# Altium footprint library ParsaLibrary.PcbLib: 526 footprints (part 27 of 33)
Each footprint in its own frame and in the unit in brackets; x right, y up, seen from the top. Pads: shape width x height; smd on the part's side, far side on the other; paste and mask are expansions set on the pad; w line width, h text height; cw(c..) or ccw(c..) is an arc to the next point about the centre after c.
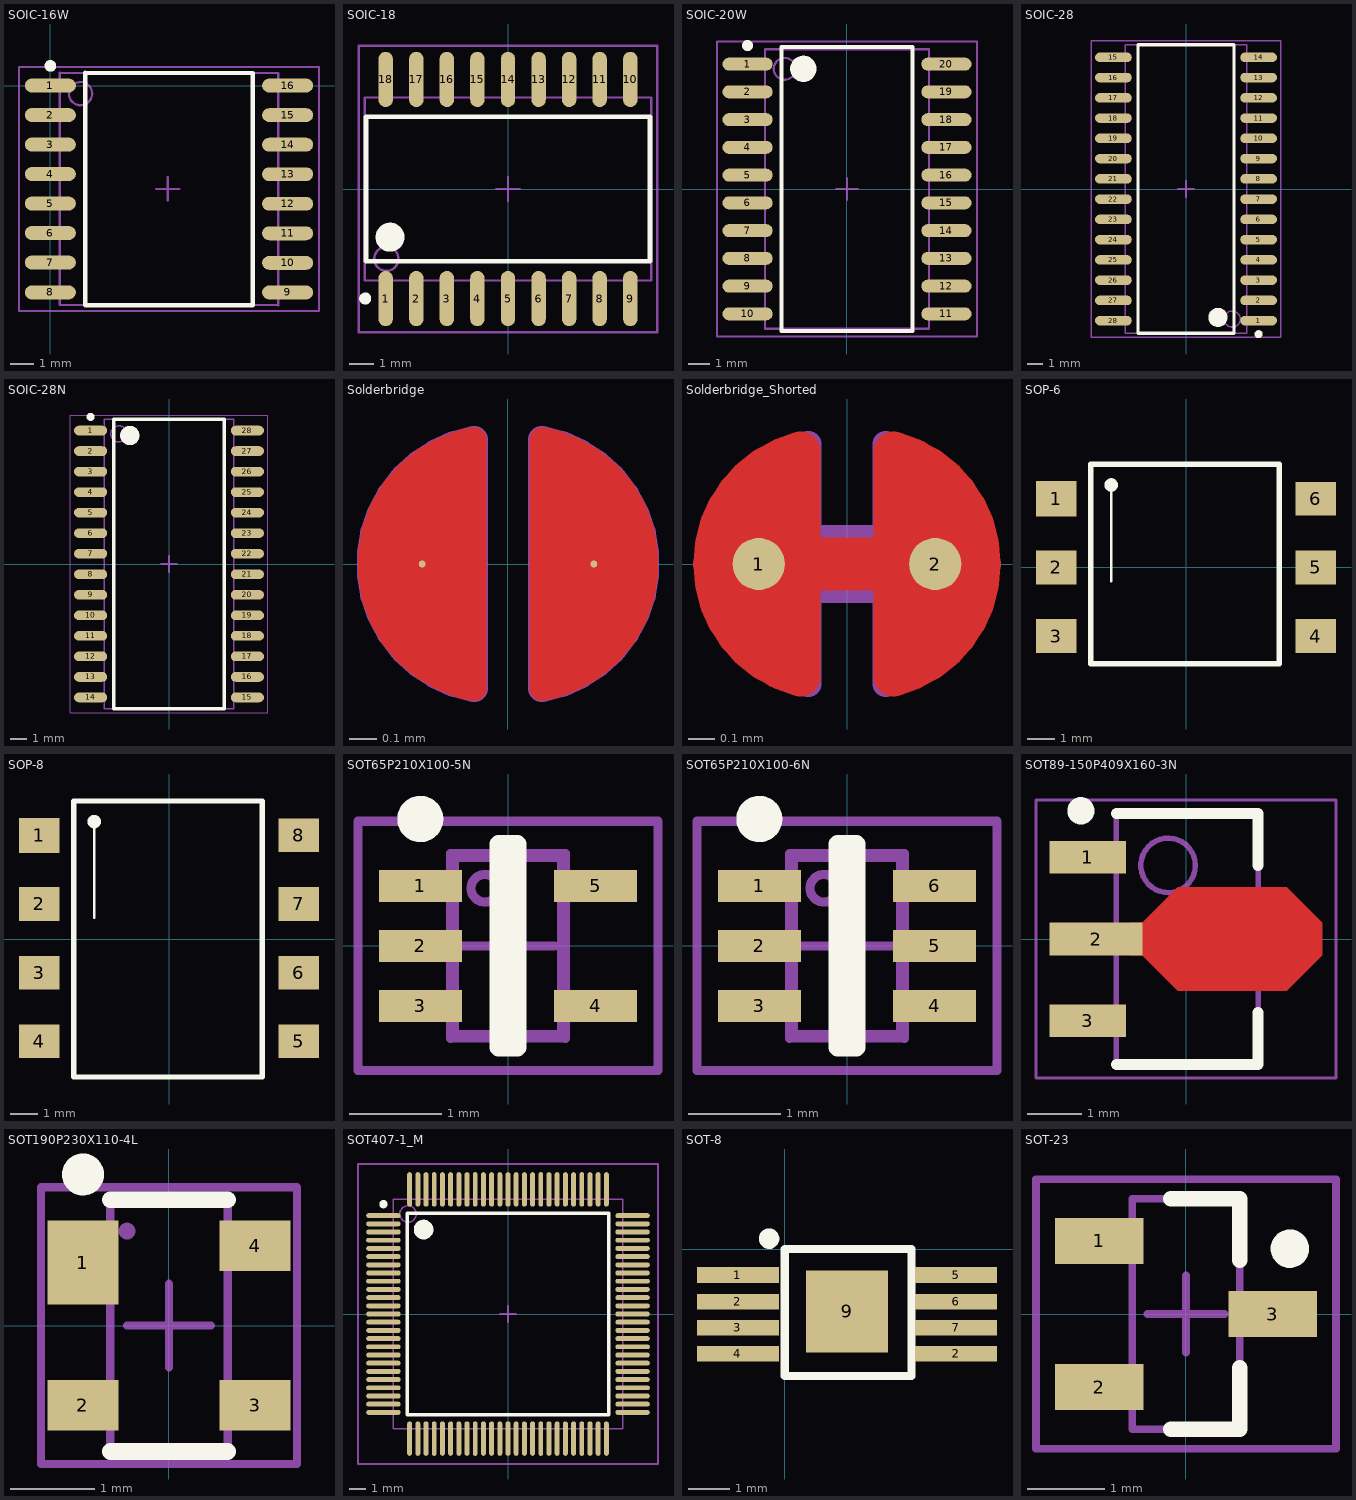
[diagram p26: the footprints below, top view; thin cyan lines are the x and y axes]

## SOIC-16W [mm]
pads (16):
  oval 2.2x0.6 smd: 1(0,0) 2(0,-1.27) 3(0,-2.54) 4(0,-3.81) 5(0,-5.08) 6(0,-6.35) 7(0,-7.62) 8(0,-8.905) 9(10.223,-8.905) 10(10.223,-7.633) 11(10.223,-6.361) 12(10.223,-5.088) 13(10.223,-3.816) 14(10.223,-2.544) 15(10.223,-1.272) 16(10.223,0)
Top Overlay:
  circle w0.25: c0,0.85 r0.125
  lines w0.2: 1.5,-9.447 8.723,-9.458 ; 1.5,-9.445 1.5,0.555 ; 1.5,0.551 8.723,0.54 8.723,-9.46
Mechanical 13:
  circle w0.1: c1.3,-0.345 r0.5
  lines w0.1: 0.4,-9.448 9.823,-9.46 9.823,0.54 0.4,0.551 ; 0.4,-9.445 0.4,0.555
Mechanical 15:
  lines w0.1: -1.35,-9.699 11.573,-9.71 11.573,0.79 ; -1.35,-9.695 -1.35,0.805 ; -1.35,0.799 11.573,0.799 ; 4.564,-4.451 5.564,-4.451 ; 5.064,-4.951 5.064,-3.951
3D body "User Library-SOIC16_Wide_JEDEC_MS-013AA.step": height 2.72, standoff 0.07, extent -0.251,-9.701 10.379,0.799

## SOIC-18 [mm]
pads (18):
  oval 0.6x2.3 smd: 1(-5.08,-4.55) 2(-3.81,-4.55) 3(-2.54,-4.55) 4(-1.27,-4.55) 5(0,-4.55) 6(1.27,-4.55) 7(2.54,-4.55) 8(3.81,-4.55) 9(5.08,-4.55) 10(5.08,4.55) 11(3.81,4.55) 12(2.54,4.55) 13(1.27,4.55) 14(0,4.55) 15(-1.27,4.55) 16(-2.54,4.55) 17(-3.81,4.55) 18(-5.08,4.55)
Top Overlay:
  circle w0.25: c-5.93,-4.55 r0.125
  circle w0.6: c-4.9,-2 r0.3
  lines w0.2: -5.9,-3 5.9,-3 5.9,3 -5.9,3 -5.9,-3
Mechanical 13:
  circle w0.1: c-5.05,-2.9 r0.5
  lines w0.1: -5.95,-3.8 5.95,-3.8 5.95,3.8 -5.95,3.8 -5.95,-3.8
Mechanical 15:
  lines w0.1: -0.5,0 0.5,0 ; 0,-0.5 0,0.5 ; -6.2,-5.95 6.2,-5.95 6.2,5.95 -6.2,5.95 -6.2,-5.95
3D body "User Library-SOIC18-300.step": height 2.65, standoff 0, extent -5.765,-5.15 5.765,5.15

## SOIC-20W [mm]
pads (20):
  oval 2.3x0.6 smd: 1(-4.55,5.715) 2(-4.55,4.445) 3(-4.55,3.175) 4(-4.55,1.905) 5(-4.55,0.635) 6(-4.55,-0.635) 7(-4.55,-1.905) 8(-4.55,-3.175) 9(-4.55,-4.445) 10(-4.55,-5.715) 11(4.55,-5.715) 12(4.55,-4.445) 13(4.55,-3.175) 14(4.55,-1.905) 15(4.55,-0.635) 16(4.55,0.635) 17(4.55,1.905) 18(4.55,3.175) 19(4.55,4.445) 20(4.55,5.715)
Top Overlay:
  circle w0.25: c-4.55,6.565 r0.125
  circle w0.6: c-2,5.5 r0.3
  lines w0.2: -3,-6.5 -3,6.5 3,6.5 3,-6.5 -3,-6.5
Mechanical 13:
  circle w0.1: c-2.85,5.5 r0.5
  lines w0.1: -3.75,-6.4 -3.75,6.4 3.75,6.4 3.75,-6.4 -3.75,-6.4
Mechanical 15:
  lines w0.1: -0.5,0 0.5,0 ; 0,-0.5 0,0.5 ; -5.95,-6.75 -5.95,6.75 5.95,6.75 5.95,-6.75 -5.95,-6.75
3D body "SO20_WIDE.step": height 1.7, standoff 0, extent -5.321,-6.223 5.321,6.223

## SOIC-28 [mm]
pads (28):
  oval 2.3x0.6 smd: 1(4.55,-8.255) 2(4.55,-6.985) 3(4.55,-5.715) 4(4.55,-4.445) 5(4.55,-3.175) 6(4.55,-1.905) 7(4.55,-0.635) 8(4.55,0.635) 9(4.55,1.905) 10(4.55,3.175) 11(4.55,4.445) 12(4.55,5.715) 13(4.55,6.985) 14(4.55,8.255) 15(-4.55,8.255) 16(-4.55,6.985) 17(-4.55,5.715) 18(-4.55,4.445) 19(-4.55,3.175) 20(-4.55,1.905) 21(-4.55,0.635) 22(-4.55,-0.635) 23(-4.55,-1.905) 24(-4.55,-3.175) 25(-4.55,-4.445) 26(-4.55,-5.715) 27(-4.55,-6.985) 28(-4.55,-8.255)
Top Overlay:
  circle w0.25: c4.55,-9.105 r0.125
  circle w0.6: c2,-8.05 r0.3
  lines w0.2: -3,-9.05 -3,9.05 3,9.05 3,-9.05 -3,-9.05
Mechanical 13:
  circle w0.1: c2.9,-8.155 r0.5
  lines w0.1: -3.8,-9.055 -3.8,9.055 3.8,9.055 3.8,-9.055 -3.8,-9.055
Mechanical 15:
  lines w0.1: -0.5,0 0.5,0 ; 0,-0.5 0,0.5 ; -5.95,-9.3 -5.95,9.3 5.95,9.3 5.95,-9.3 -5.95,-9.3
3D body "User Library-28-SOIC.step": height 2.83, standoff 0.07, extent -5.15,-9.017 5.15,8.883

## SOIC-28N [mm]
pads (28):
  oval 2.05x0.6 smd: 1(-4.85,8.255) 2(-4.85,6.985) 3(-4.85,5.715) 4(-4.85,4.445) 5(-4.85,3.175) 6(-4.85,1.905) 7(-4.85,0.635) 8(-4.85,-0.635) 9(-4.85,-1.905) 10(-4.85,-3.175) 11(-4.85,-4.445) 12(-4.85,-5.715) 13(-4.85,-6.985) 14(-4.85,-8.255) 15(4.85,-8.255) 16(4.85,-6.985) 17(4.85,-5.715) 18(4.85,-4.445) 19(4.85,-3.175) 20(4.85,-1.905) 21(4.85,-0.635) 22(4.85,0.635) 23(4.85,1.905) 24(4.85,3.175) 25(4.85,4.445) 26(4.85,5.715) 27(4.85,6.985) 28(4.85,8.255)
Top Overlay:
  circle w0.25: c-4.85,9.105 r0.125
  circle w0.6: c-2.425,7.95 r0.3
  lines w0.2: -3.425,-8.95 -3.425,8.95 3.425,8.95 3.425,-8.95 -3.425,-8.95
Mechanical 13:
  circle w0.1: c-3.1,8.05 r0.5
  lines w0.1: -4,-8.95 -4,8.95 4,8.95 4,-8.95 -4,-8.95
Mechanical 15:
  lines w0.05: -6.1,-9.2 -6.1,9.2 6.1,9.2 6.1,-9.2 -6.1,-9.2
  lines w0.1: -0.5,0 0.5,0 ; 0,-0.5 0,0.5
3D body "SOIC28 wide.stp": height 2, standoff 0, extent -5.081,-9.04 5.082,9.04

## Solderbridge [mil]
pads (2):
  round 1 smd: 1(-12.44,0) 2(12.44,0)
Top Layer:
  region: -3.14,17.94 -3.14,18.31 -3.42,18.99 -3.94,19.52 -4.63,19.8 -5,19.8 -4.99,19.8 -6.74,19.51 -10.06,18.32 -13.14,16.57 -15.86,14.32 -18.14,11.62 -19.91,8.56 -21.13,5.24 -21.75,1.76 -21.74,-1.77 -21.13,-5.25 -19.91,-8.57 -18.13,-11.62 -15.85,-14.32 -13.13,-16.58 -10.06,-18.33 -6.73,-19.51 -4.98,-19.8 -5,-19.8 -4.63,-19.8 -3.94,-19.52 -3.42,-18.99 -3.14,-18.31 -3.14,-17.94
  region: 3.14,-17.94 3.14,-18.31 3.42,-18.99 3.95,-19.52 4.63,-19.8 5,-19.8 6.74,-19.51 10.07,-18.32 13.14,-16.57 15.86,-14.32 18.14,-11.62 19.92,-8.56 21.13,-5.24 21.75,-1.76 21.75,1.77 21.13,5.25 19.91,8.57 18.14,11.62 15.85,14.32 13.13,16.58 10.06,18.33 6.73,19.51 4.99,19.8 5,19.8 4.63,19.8 3.95,19.52 3.42,18.99 3.14,18.31 3.14,17.94
Mechanical 7:
  lines w3.94: -4.86,-18.07 cw(c-1.67,0) -4.86,18.07 -4.86,-18.07 ; 4.86,-18.07 ccw(c1.67,0) 4.86,18.07 4.86,-18.07
  text ".Designator" at -49.95,15.62 h15

## Solderbridge_Shorted [mm]
pads (2):
  round 0.2 smd paste-10: 1(-0.338,0) 2(0.338,0)
Top Layer:
  region: -0.102,-0.432 -0.178,-0.505 -0.296,-0.467 -0.361,-0.424 -0.434,-0.351 -0.488,-0.292 -0.546,-0.193 -0.574,-0.099 -0.569,0.122 -0.544,0.193 -0.46,0.33 -0.376,0.411 -0.284,0.469 -0.183,0.5 -0.132,0.483 -0.102,0.43
  region: 0.102,0.432 0.178,0.505 0.296,0.467 0.361,0.424 0.434,0.351 0.488,0.292 0.546,0.193 0.574,0.099 0.569,-0.122 0.544,-0.193 0.46,-0.33 0.376,-0.411 0.284,-0.469 0.183,-0.5 0.132,-0.483 0.102,-0.43
  lines w0.152: -0.178,-0.431 cw(c-0.068,0) -0.178,0.431 ; 0.178,-0.431 ccw(c0.068,0) 0.178,0.431
  lines w0.203: -0.338,0 0.338,0
Top Solder:
  circle w0.61: c0.028,0 r0.279
  circle w0.61: c-0.028,0 r0.279
Mechanical 7:
  lines w0.1: -0.148,-0.459 cw(c-0.067,0) -0.148,0.459 -0.148,0.1 0.148,0.1 0.148,0.459 cw(c0.067,0) 0.148,-0.459 0.148,-0.1 -0.148,-0.1 -0.148,-0.459
  text ".Designator" at -0.635,0.635 h0.38

## SOP-6 [mm]
pads (6):
  rect 1.5x1.3 smd: 1(-4.8,2.54)
  rect 1.5x1.25 smd: 2(-4.8,0) 3(-4.8,-2.54) 4(4.8,-2.54) 5(4.8,0) 6(4.8,2.54)
Top Overlay:
  circle w0.25: c-2.768,3.048 r0.125
  lines w0.1: -2.768,-0.508 -2.768,3.175
  lines w0.2: -3.53,-3.56 3.455,-3.56 3.455,3.81 -3.53,3.81 -3.53,-3.56
3D body "User Library-PC817_Gullwing.STEP": height 3.85, standoff 0, extent -4.974,-3.56 5.026,1.02
3D body "User Library-PC817_Gullwing.STEP": height 3.85, standoff 0, extent -4.974,-1.02 5.026,3.56

## SOP-8 [mm]
pads (8):
  rect 1.5x1.3 smd: 1(-4.8,3.84)
  rect 1.5x1.25 smd: 2(-4.8,1.3) 3(-4.8,-1.24) 4(-4.8,-3.78) 5(4.8,-3.78) 6(4.8,-1.24) 7(4.8,1.3) 8(4.8,3.84)
Top Overlay:
  circle w0.25: c-2.768,4.348 r0.125
  lines w0.1: -2.768,0.792 -2.768,4.475
  lines w0.2: -3.53,-5.1 3.455,-5.1 3.455,5.11 -3.53,5.11 -3.53,-5.1
3D body "User Library-PC817_Gullwing.STEP": height 3.85, standoff 0, extent -4.974,-2.26 5.026,2.32
3D body "User Library-PC817_Gullwing.STEP": height 3.85, standoff 0, extent -4.974,0.28 5.026,4.86
3D body "User Library-PC817_Gullwing.STEP": height 3.85, standoff 0, extent -4.974,-4.8 5.026,-0.22

## SOT65P210X100-5N [mm]
pads (5):
  rect 0.9x0.35 smd: 1(-0.95,0.65) 2(-0.95,0) 3(-0.95,-0.65) 4(0.95,-0.65) 5(0.95,0.65)
Top Overlay:
  circle w0.25: c-0.95,1.375 r0.125
  lines w0.2: -0.1,-1.1 0.1,-1.1 0.1,1.1 -0.1,1.1 -0.1,-1.1
Mechanical 7:
  circle w0.1: c-0.25,0.625 r0.15
  lines w0.1: -1.048,-0.748 -1.048,-0.545 ; -1.048,-0.101 -1.048,0.103 ; -1.048,0.547 -1.048,0.75 ; -0.862,-0.76 -0.862,-0.532 ; -0.862,-0.113 -0.862,0.115 ; -0.862,0.534 -0.862,0.762 ; -0.624,-0.999 -0.624,-0.998 ; -0.624,-0.76 -0.624,-0.998 ; -0.624,-0.532 -0.624,-0.113 ; -0.624,0.115 -0.624,0.534 ; -0.624,0.762 -0.624,1 0.624,1 0.624,0.762 ; 0.624,-0.999 0.624,-0.998 ; 0.624,-0.76 0.624,-0.998 ; 0.624,-0.532 0.624,0.534 ; 0.862,-0.76 0.862,-0.532 ; 0.862,0.534 0.862,0.762 ; 1.048,-0.748 1.048,-0.545 ; 1.048,0.547 1.048,0.75 ; -0.624,-0.998 0.624,-0.998 ; -1.048,-0.76 -1.048,-0.532 -0.611,-0.532 -0.611,-0.76 -1.048,-0.76 ; -1.048,-0.113 -0.611,-0.113 -0.611,0.115 -1.048,0.115 -1.048,-0.113 ; -1.048,0.534 -1.048,0.762 -0.611,0.762 -0.611,0.534 -1.048,0.534 ; -0.582,-0.96 0.582,-0.96 0.582,0.961 -0.582,0.961 -0.582,-0.96 ; 0.611,-0.76 1.048,-0.76 1.048,-0.532 0.611,-0.532 0.611,-0.76 ; 0.611,0.534 1.048,0.534 1.048,0.762 0.611,0.762 0.611,0.534
  text ".Designator" at 0.4,-0.55 h0.38
Mechanical 15:
  lines w0.1: -0.5,0 0.5,0 ; 0,-0.5 0,0.5 ; -1.625,-1.35 -1.625,1.35 1.625,1.35 1.625,-1.35 -1.625,-1.35
3D body "User Library-SC70-5.STEP": height 0.97, standoff 0, extent -1.1,-1 1.1,1

## SOT65P210X100-6N [mm]
pads (6):
  rect 0.9x0.35 smd: 1(-0.95,0.65) 2(-0.95,0) 3(-0.95,-0.65) 4(0.95,-0.65) 5(0.95,0) 6(0.95,0.65)
Top Overlay:
  circle w0.25: c-0.95,1.375 r0.125
  lines w0.2: -0.1,-1.1 -0.1,1.1 0.1,1.1 0.1,-1.1 -0.1,-1.1
Mechanical 7:
  circle w0.1: c-0.25,0.625 r0.15
  lines w0.1: -1.048,-0.748 -1.048,-0.545 ; -1.048,-0.101 -1.048,0.103 ; -1.048,0.547 -1.048,0.75 ; -0.862,-0.76 -0.862,-0.532 ; -0.862,-0.113 -0.862,0.115 ; -0.862,0.534 -0.862,0.762 ; -0.624,-0.999 -0.624,-0.998 ; -0.624,-0.76 -0.624,-0.998 ; -0.624,-0.532 -0.624,-0.113 ; -0.624,0.115 -0.624,0.534 ; -0.624,0.762 -0.624,1 0.624,1 0.624,0.762 ; 0.624,-0.999 0.624,-0.998 ; 0.624,-0.76 0.624,-0.998 ; 0.624,-0.532 0.624,-0.113 ; 0.624,0.115 0.624,0.534 ; 0.862,-0.76 0.862,-0.532 ; 0.862,-0.113 0.862,0.115 ; 0.862,0.534 0.862,0.762 ; 1.048,-0.748 1.048,-0.545 ; 1.048,-0.101 1.048,0.103 ; 1.048,0.547 1.048,0.75 ; -0.624,-0.998 0.624,-0.998 ; -1.048,-0.76 -1.048,-0.532 -0.611,-0.532 -0.611,-0.76 -1.048,-0.76 ; -1.048,-0.113 -0.611,-0.113 -0.611,0.115 -1.048,0.115 -1.048,-0.113 ; -1.048,0.534 -1.048,0.762 -0.611,0.762 -0.611,0.534 -1.048,0.534 ; -0.582,-0.96 0.582,-0.96 0.582,0.961 -0.582,0.961 -0.582,-0.96 ; 0.611,-0.76 1.048,-0.76 1.048,-0.532 0.611,-0.532 0.611,-0.76 ; 0.611,-0.113 0.611,0.115 1.048,0.115 1.048,-0.113 0.611,-0.113 ; 0.611,0.534 1.048,0.534 1.048,0.762 0.611,0.762 0.611,0.534
  text ".Designator" at 0.4,-0.55 h0.38
Mechanical 15:
  lines w0.1: -0.5,0 0.5,0 ; 0,-0.5 0,0.5 ; -1.625,-1.35 1.625,-1.35 1.625,1.35 -1.625,1.35 -1.625,-1.35
3D body "SW3dPS-SC70-6.STEP": height 0.92, standoff -0.03, extent -1.05,-1 1.05,1

## SOT89-150P409X160-3N [mm]
pads (3):
  rect 1.4x0.6 smd: 1(-1.8,1.5) 3(-1.8,-1.5)
  rect 1.7x0.6 smd: 2(-1.65,0)
Top Layer:
  rectangle: -1.016,-0.3 -0.635,0.3
  region: -0.8,0.3 -0.15,0.95 1.85,0.95 2.5,0.3 2.5,-0.3 1.85,-0.95 -0.15,-0.95 -0.8,-0.3
Top Overlay:
  circle w0.25: c-1.928,2.35 r0.125
  lines w0.2: -1.278,-2.3 1.322,-2.3 1.322,-1.35 ; -1.278,2.3 1.322,2.3 1.322,1.35
Mechanical 7:
  circle w0.1: c-0.327,1.35 r0.5
  lines w0.1: -1.278,-2.3 -1.278,2.3 1.322,2.3 1.322,-2.3 -1.278,-2.3
  text ".Designator" at -0.889,-0.127 h0.38
Mechanical 15:
  lines w0.05: -2.75,-2.55 -2.75,2.55 2.75,2.55 2.75,-2.55 -2.75,-2.55
  lines w0.1: -0.478,0 0.522,0 ; 0.022,-0.5 0.022,0.5
3D body "SOT89-150P409X160-3N.step": height 1.6, standoff 0, extent -2.2,-2.297 1.93,2.297

## SOT190P230X110-4L [mm]
pads (4):
  rect 0.85x1 smd: 1(-1.025,0.75)
  rect 0.85x0.6 smd: 2(-1.025,-0.95) 3(1.025,-0.95) 4(1.025,0.95)
Top Overlay:
  circle w0.25: c-1.025,1.8 r0.125
  lines w0.2: -0.7,-1.5 0.7,-1.5 ; -0.7,1.5 0.7,1.5
Mechanical 7:
  circle w0.1: c-0.5,1.125 r0.05
  lines w0.1: -0.7,-1.5 0.7,-1.5 0.7,1.5 -0.7,1.5 -0.7,-1.5
  text ".Designator" at -0.225,1.375 h0.69
Mechanical 15:
  lines w0.1: -0.5,0 0.5,0 ; 0,-0.5 0,0.5 ; -1.525,-1.65 1.525,-1.65 1.525,1.65 -1.525,1.65 -1.525,-1.65
3D body "User Library-sot143.step": height 1, standoff 0, extent -1.21,-1.46 1.21,1.46

## SOT407-1_M [mm] "Thin QFP, 100-Leads, Body 14x14mm, Pitch 0.5mm, IPC Low Density"
height 1.6
pads (100):
  oval 2.1x0.3 smd: 1(-7.6,6) 2(-7.6,5.5) 3(-7.6,5) 4(-7.6,4.5) 5(-7.6,4) 6(-7.6,3.5) 7(-7.6,3) 8(-7.6,2.5) 9(-7.6,2) 10(-7.6,1.5) 11(-7.6,1) 12(-7.6,0.5) 13(-7.6,0) 14(-7.6,-0.5) 15(-7.6,-1) 16(-7.6,-1.5) 17(-7.6,-2) 18(-7.6,-2.5) 19(-7.6,-3) 20(-7.6,-3.5) 21(-7.6,-4) 22(-7.6,-4.5) 23(-7.6,-5) 24(-7.6,-5.5) 25(-7.6,-6) 51(7.6,-6) 52(7.6,-5.5) 53(7.6,-5) 54(7.6,-4.5) 55(7.6,-4) 56(7.6,-3.5) 57(7.6,-3) 58(7.6,-2.5) 59(7.6,-2) 60(7.6,-1.5) 61(7.6,-1) 62(7.6,-0.5) 63(7.6,0) 64(7.6,0.5) 65(7.6,1) 66(7.6,1.5) 67(7.6,2) 68(7.6,2.5) 69(7.6,3) 70(7.6,3.5) 71(7.6,4) 72(7.6,4.5) 73(7.6,5) 74(7.6,5.5) 75(7.6,6)
  oval 0.3x2.1 smd: 26(-6,-7.6) 27(-5.5,-7.6) 28(-5,-7.6) 29(-4.5,-7.6) 30(-4,-7.6) 31(-3.5,-7.6) 32(-3,-7.6) 33(-2.5,-7.6) 34(-2,-7.6) 35(-1.5,-7.6) 36(-1,-7.6) 37(-0.5,-7.6) 38(0,-7.6) 39(0.5,-7.6) 40(1,-7.6) 41(1.5,-7.6) 42(2,-7.6) 43(2.5,-7.6) 44(3,-7.6) 45(3.5,-7.6) 46(4,-7.6) 47(4.5,-7.6) 48(5,-7.6) 49(5.5,-7.6) 50(6,-7.6) 76(6,7.6) 77(5.5,7.6) 78(5,7.6) 79(4.5,7.6) 80(4,7.6) 81(3.5,7.6) 82(3,7.6) 83(2.5,7.6) 84(2,7.6) 85(1.5,7.6) 86(1,7.6) 87(0.5,7.6) 88(0,7.6) 89(-0.5,7.6) 90(-1,7.6) 91(-1.5,7.6) 92(-2,7.6) 93(-2.5,7.6) 94(-3,7.6) 95(-3.5,7.6) 96(-4,7.6) 97(-4.5,7.6) 98(-5,7.6) 99(-5.5,7.6) 100(-6,7.6)
Top Overlay:
  circle w0.6: c-5.15,5.15 r0.3
  circle w0.25: c-7.6,6.7 r0.125
  lines w0.2: -6.15,-6.15 6.15,-6.15 6.15,6.15 -6.15,6.15 -6.15,-6.15
Mechanical 13:
  circle w0.1: c-6.1,6.1 r0.5
  lines w0.1: -7,-7 7,-7 7,7 -7,7 -7,-7
Mechanical 15:
  lines w0.1: -0.5,0 0.5,0 ; 0,-0.5 0,0.5 ; -9.15,-9.15 9.15,-9.15 9.15,9.15 -9.15,9.15 -9.15,-9.15
3D body: height 1.6, standoff 0, extent -7,-7 7,7

## SOT-8 [mm]
pads (9):
  rect 2x0.38 smd: 1(-1.143,-0.635) 2(-1.143,-1.285) 2(4.191,-2.555) 3(-1.143,-1.92) 4(-1.143,-2.555) 5(4.191,-0.635) 6(4.191,-1.285) 7(4.191,-1.92)
  rect 2x2 smd: 9(1.524,-1.524)
Top Overlay:
  circle w0.25: c-0.381,0.254 r0.125
  lines w0.2: 0,-3.1 0,0 3.1,0 3.1,-3.1 0,-3.1

## SOT-23 [mm]
pads (3):
  rect 1.15x0.6 smd: 1(-1.125,0.95) 2(-1.125,-0.95) 3(1.125,0)
Top Overlay:
  circle w0.25: c1.35,0.85 r0.125
  lines w0.2: -0.2,-1.5 0.7,-1.5 0.7,-0.7 ; -0.2,1.5 0.7,1.5 0.7,0.7
Mechanical 13:
  lines w0.1: -0.7,-1.5 0.7,-1.5 0.7,1.5 -0.7,1.5 -0.7,-1.5
Mechanical 15:
  lines w0.1: -0.5,0 0.5,0 ; 0,-0.5 0,0.5 ; -1.95,-1.75 1.95,-1.75 1.95,1.75 -1.95,1.75 -1.95,-1.75
3D body "SOT23.STEP": height 1.2, standoff -0.02, extent -1.126,-1.5 1.126,1.5